# Altium footprint library PcbLibLafe.PcbLib: 294 footprints (part 18 of 19)
Each footprint in its own frame and in the unit in brackets; x right, y up, seen from the top. Pads: shape width x height; smd on the part's side, far side on the other; paste and mask are expansions set on the pad; w line width, h text height; cw(c..) or ccw(c..) is an arc to the next point about the centre after c.
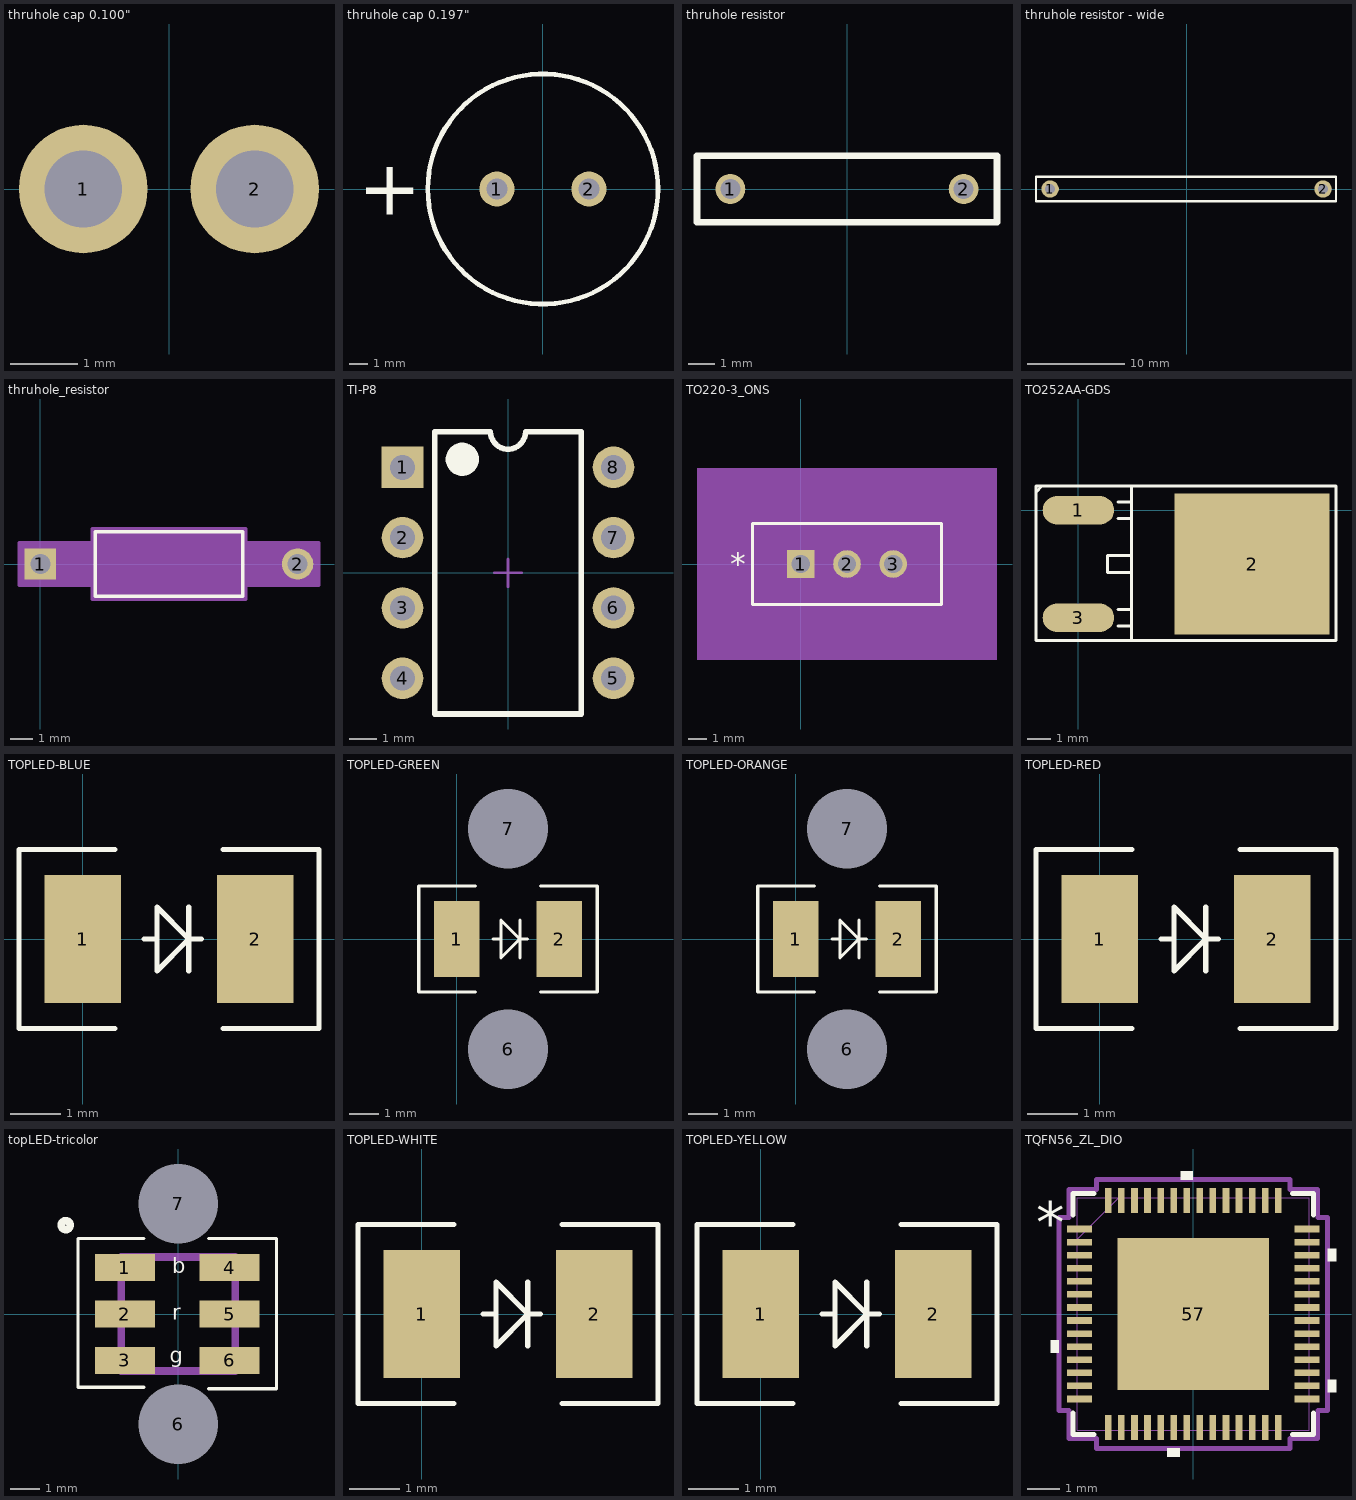
[diagram p17: the footprints below, top view; thin cyan lines are the x and y axes]

## thruhole cap 0.100" [mil]
pads (2):
  round 75 hole 45: 1(-50,0) 2(50,0)
3D body "C320C104K5R5TA.step": height 289.76, standoff -275.59, extent -100,-64 100,61.39

## thruhole cap 0.197" [mil] "radial cap"
pads (2):
  round 75 hole 45: 1(-98.43,0) 2(98.43,0)
Top Overlay:
  circle w10: c0,0 r246.06
  text "+" at -395.31,-54.99 h118.11
3D body "CAPPRD500W60D1250H2150.step": height 846.46, standoff -748.03, extent -244.06,-256.06 248.06,236.06

## thruhole resistor [mil] "thruhole resistor"
pads (2):
  round 45 hole 30: 1(-175,0) 2(175,0)
Top Overlay:
  lines w10: -225,-50 225,-50 225,50 -225,50 -225,-50

## thruhole resistor - wide [mil] "thruhole resistor"
pads (2):
  round 70 hole 40: 1(-550,0) 2(550,0)
Top Overlay:
  lines w10: -607,-50 -607,50 602,50 602,-50 -607,-50

## thruhole_resistor [mil]
pads (2):
  rect 55x55 / inner round 60 / far side rect 55x55 hole 35 paste-99999 mask+0: 1(0,0)
  round 55 / inner round 60 / far side round 55 hole 35 paste-99999 mask+0: 2(450,0)
Top Overlay:
  lines w6: 96,-56.5 354,-56.5 354,56.5 96,56.5 96,-56.5
Mechanical 13:
  lines w1: 0,0 101,0 ; 349,0 450,0 ; 101,-51.5 349,-51.5 349,51.5 101,51.5 101,-51.5
Mechanical 15:
  region: 91,-37.5 -37.5,-37.5 -37.5,37.5 91,37.5 91,61.5 359,61.5 359,37.5 487.5,37.5 487.5,-37.5 359,-37.5 359,-61.5 91,-61.5
  lines w6: -37.5,-37.5 -37.5,37.5 91,37.5 91,61.5 359,61.5 359,37.5 487.5,37.5 487.5,-37.5 359,-37.5 359,-61.5 91,-61.5 91,-37.5 -37.5,-37.5
3D body "STA_CF14_STP.step": height 103, standoff -110, extent -12.48,-51.12 462.48,51.12

## TI-P8 [mm] "DIP, 8-Leads, Body 9.59x6.35mm, Pitch 2.54mm"
height 5.08
pads (8):
  rect 1.5x1.5 hole 0.9: 1(-3.81,3.81)
  round 1.5 hole 0.9: 2(-3.81,1.27) 3(-3.81,-1.27) 4(-3.81,-3.81) 5(3.81,-3.81) 6(3.81,-1.27) 7(3.81,1.27) 8(3.81,3.81)
Top Overlay:
  circle w0.6: c-1.65,4.1 r0.3
  lines w0.2: -2.65,-5.1 -2.65,5.1 -0.635,5.1 ccw(c0,5.1) 0.635,5.1 2.65,5.1 2.65,-5.1 -2.65,-5.1
Mechanical 15:
  lines w0.1: -0.5,0 0.5,0 ; 0,-0.5 0,0.5
3D body: height 2.66, standoff 0, extent -3.945,3.31 -3.675,4.31
3D body: height 0, standoff -1.6, extent -3.945,3.45 -3.675,4.17
3D body: height 2.66, standoff 0, extent -3.945,0.77 -3.675,1.77
3D body: height 0, standoff -1.6, extent -3.945,0.91 -3.675,1.63
3D body: height 2.66, standoff 0, extent -3.945,-1.77 -3.675,-0.77
3D body: height 2.93, standoff 2.66, extent -3.945,-1.77 -3.3,-0.77
3D body: height 0, standoff -1.6, extent -3.945,-1.63 -3.675,-0.91
3D body: height 2.66, standoff 0, extent -3.945,-4.31 -3.675,-3.31
3D body: height 2.93, standoff 2.66, extent -3.945,-4.31 -3.3,-3.31
3D body: height 0, standoff -1.6, extent -3.945,-4.17 -3.675,-3.45
3D body: height 2.66, standoff 0, extent 3.675,-4.31 3.945,-3.31
3D body: height 2.93, standoff 2.66, extent 3.3,-4.31 3.945,-3.31
3D body: height 0, standoff -1.6, extent 3.675,-4.17 3.945,-3.45
3D body: height 2.66, standoff 0, extent 3.675,-1.77 3.945,-0.77
3D body: height 2.93, standoff 2.66, extent 3.3,-1.77 3.945,-0.77
3D body: height 0, standoff -1.6, extent 3.675,-1.63 3.945,-0.91
3D body: height 2.66, standoff 0, extent 3.675,0.77 3.945,1.77
3D body: height 2.93, standoff 2.66, extent 3.3,0.77 3.945,1.77
3D body: height 0, standoff -1.6, extent 3.675,0.91 3.945,1.63
3D body: height 2.66, standoff 0, extent 3.675,3.31 3.945,4.31
3D body: height 2.93, standoff 2.66, extent 3.3,3.31 3.945,4.31
3D body: height 0, standoff -1.6, extent 3.675,3.45 3.945,4.17

## TO220-3_ONS [mil]
pads (3):
  rect 60x60 hole 40 mask+0: 1(0,0)
  round 60 hole 40 mask+0: 2(100,0) 3(200,0)
Top Overlay:
  lines w6: -105,-87.5 305,-87.5 305,87.5 -105,87.5 -105,-87.5
  text "*" at -152.5,-25 h50
Mechanical 5:
  region: 425,-207.5 -225,-207.5 -225,207.5 425,207.5
Mechanical 13:
  lines w1: -100,-82.5 300,-82.5 300,82.5 -100,82.5 -100,-82.5
  text "*" at -102.5,-25 h50
Mechanical 15:
  region: 310,-92.5 -110,-92.5 -110,92.5 310,92.5
  lines w6: -110,-92.5 -110,92.5 310,92.5 310,-92.5 -110,-92.5
3D body "TO220-3_ONS.step": height 625, standoff -380, extent -100,-82.52 300,82.52

## TO252AA-GDS [mm]
pads (3):
  oval 3x1.2 smd: 1(0,0) 3(0,-4.5)
  rect 6.5x5.9 smd: 2(7.275,-2.25)
Top Overlay:
  lines w0.127: -1.778,0.762 -1.524,1.016 ; 1.65,-4.85 2.225,-4.85 ; 1.65,-4.15 2.225,-4.15 ; 2.225,-5.45 2.225,0.95 ; 2.225,-2.6 1.225,-2.6 1.225,-1.9 2.225,-1.9 ; -1.778,-5.461 -1.778,1.016 10.795,1.016 10.795,-5.461 -1.778,-5.461 ; 1.65,-0.35 2.225,-0.35 1.65,-0.35 ; 1.65,0.35 2.225,0.35 1.65,0.35
3D body "User Library-DPAK-1.step": height 2.41, standoff 0, extent -0.324,-5.505 9.614,1.035

## TOPLED-BLUE [mil]
pads (2):
  rect 60x100 smd: 1(0,0) 2(135,0)
Top Overlay:
  lines w4: 25,-70 -50,-70 -50,70 25,70 ; 83,-25 83,0 ; 83,25 83,0 ; 93,0 83,0 ; 110,-70 185,-70 185,70 110,70 ; 58,0 48,0 58,0 ; 58,0 58,25 83,0 ; 58,0 58,-25 83,0
3D body: height 61, standoff 60, extent -2.8,-60 20,-37.2
3D body: height 70, standoff 60, extent 30,-40 110,40
3D body: height 60, standoff 15, extent -2.8,-60 137.4,60
3D body: height 19.68, standoff 0, extent 40,-60 95,60
3D body: height 43.31, standoff 0, extent -19.53,-31.5 -7.72,32.48
3D body: height 43.31, standoff 27.56, extent -19.53,-31.5 -2.8,32.48
3D body: height 11.81, standoff 0, extent -19.53,-31.5 18.86,32.48
3D body: height 11.81, standoff 0, extent 115.75,-31.5 154.13,32.48
3D body: height 43.31, standoff 27.56, extent 137.4,-31.5 154.13,32.48
3D body: height 43.31, standoff 0, extent 142.32,-31.5 154.13,32.48
3D body: height 75, standoff 60, extent -2.8,-60 137.4,60
3D body: height 65, standoff 60, extent 60,-10 75,5
3D body: height 61, standoff 60, extent 54.69,-36.96 110.35,36.96
3D body: height 61, standoff 60, extent 30,-10 50,5

## TOPLED-GREEN [mil]
pads (4):
  rect 60x100 smd: 1(0,0) 2(135,0)
  round 60 hole 105 mask+50: 6(67.5,-145)
  round 60 hole 105: 7(67.5,145)
Top Overlay:
  lines w4: 25,-70 -50,-70 -50,70 25,70 ; 83,-25 83,0 ; 83,25 83,0 ; 93,0 83,0 ; 110,-70 185,-70 185,70 110,70 ; 58,0 58,-25 83,0 ; 58,0 48,0 58,0 ; 58,0 58,25 83,0
3D body: height 61, standoff 60, extent 30,-10 50,5
3D body: height 61, standoff 60, extent 54.69,-36.96 110.35,36.96
3D body: height 65, standoff 60, extent 60,-10 75,5
3D body: height 75, standoff 60, extent -4.65,-59.72 135.55,60.28
3D body: height 43.31, standoff 0, extent 142.32,-31.5 154.13,32.48
3D body: height 43.31, standoff 27.56, extent 137.4,-31.5 154.13,32.48
3D body: height 11.81, standoff 0, extent 115.75,-31.5 154.13,32.48
3D body: height 11.81, standoff 0, extent -19.53,-31.5 18.86,32.48
3D body: height 43.31, standoff 27.56, extent -19.53,-31.5 -2.8,32.48
3D body: height 43.31, standoff 0, extent -19.53,-31.5 -7.72,32.48
3D body: height 19.68, standoff 0, extent 40,-60 95,60
3D body: height 60, standoff 15, extent -2.8,-60 137.4,60
3D body: height 70, standoff 60, extent 30,-40 110,40
3D body: height 61, standoff 60, extent -2.8,-60 20,-37.2

## TOPLED-ORANGE [mil]
pads (4):
  rect 60x100 smd: 1(0,0) 2(135,0)
  round 60 hole 105 mask+50: 6(67.5,-145)
  round 60 hole 105: 7(67.5,145)
Top Overlay:
  lines w4: 25,-70 -50,-70 -50,70 25,70 ; 83,-25 83,0 ; 83,25 83,0 ; 93,0 83,0 ; 110,-70 185,-70 185,70 110,70 ; 58,0 48,0 58,0 ; 58,0 58,25 83,0 ; 58,0 58,-25 83,0
3D body: height 61, standoff 60, extent -2.8,-60 20,-37.2
3D body: height 70, standoff 60, extent 30,-40 110,40
3D body: height 60, standoff 15, extent -2.8,-60 137.4,60
3D body: height 19.68, standoff 0, extent 40,-60 95,60
3D body: height 43.31, standoff 0, extent -19.53,-31.5 -7.72,32.48
3D body: height 43.31, standoff 27.56, extent -19.53,-31.5 -2.8,32.48
3D body: height 11.81, standoff 0, extent -19.53,-31.5 18.86,32.48
3D body: height 11.81, standoff 0, extent 115.75,-31.5 154.13,32.48
3D body: height 43.31, standoff 27.56, extent 137.4,-31.5 154.13,32.48
3D body: height 43.31, standoff 0, extent 142.32,-31.5 154.13,32.48
3D body: height 75, standoff 60, extent -2.8,-60 137.4,60
3D body: height 65, standoff 60, extent 60,-10 75,5
3D body: height 61, standoff 60, extent 54.69,-36.96 110.35,36.96
3D body: height 61, standoff 60, extent 30,-10 50,5

## TOPLED-RED [mil]
pads (2):
  rect 60x100 smd: 1(0,0) 2(135,0)
Top Overlay:
  lines w4: 25,-70 -50,-70 -50,70 25,70 ; 83,-25 83,0 ; 83,25 83,0 ; 93,0 83,0 ; 110,-70 185,-70 185,70 110,70 ; 58,0 48,0 58,0 ; 58,0 58,25 83,0 ; 58,0 58,-25 83,0
3D body: height 61, standoff 60, extent -2.8,-60 20,-37.2
3D body: height 70, standoff 60, extent 30,-40 110,40
3D body: height 60, standoff 15, extent -2.8,-60 137.4,60
3D body: height 19.68, standoff 0, extent 40,-60 95,60
3D body: height 43.31, standoff 0, extent -19.53,-31.5 -7.72,32.48
3D body: height 43.31, standoff 27.56, extent -19.53,-31.5 -2.8,32.48
3D body: height 11.81, standoff 0, extent -19.53,-31.5 18.86,32.48
3D body: height 11.81, standoff 0, extent 115.75,-31.5 154.13,32.48
3D body: height 43.31, standoff 27.56, extent 137.4,-31.5 154.13,32.48
3D body: height 43.31, standoff 0, extent 142.32,-31.5 154.13,32.48
3D body: height 75, standoff 60, extent -2.8,-60 137.4,60
3D body: height 65, standoff 60, extent 60,-10 75,5
3D body: height 61, standoff 60, extent 54.69,-36.96 110.35,36.96
3D body: height 61, standoff 60, extent 30,-10 50,5

## topLED-tricolor [mm]
pads (8):
  rect 2x0.9 smd: 1(-1.778,1.55) 2(-1.778,0) 3(-1.778,-1.55) 4(1.722,1.55) 5(1.722,0) 6(1.722,-1.55)
  round 1.524 hole 2.667 mask+1.27: 6(0,-3.683)
  round 1.524 hole 2.667: 7(0,3.683)
Top Overlay:
  circle w0.254: c-3.759,2.971 r0.148
  lines w0.102: -1.143,-2.45 -3.353,-2.45 -3.353,2.525 -1.143,2.525 ; 1.016,-2.5 3.297,-2.5 3.297,2.525 1.016,2.525
  text "b" at -0.203,1.371 h0.51
  text "r" at -0.191,-0.189 h0.51
  text "g" at -0.279,-1.635 h0.51
Mechanical 3:
  lines w0.254: -1.905,-1.905 -1.905,1.905 1.905,1.905 1.905,-1.905 -1.905,-1.905

## TOPLED-WHITE [mil]
pads (2):
  rect 60x100 smd: 1(0,0) 2(135,0)
Top Overlay:
  lines w4: 25,-70 -50,-70 -50,70 25,70 ; 83,-25 83,0 ; 83,25 83,0 ; 93,0 83,0 ; 110,-70 185,-70 185,70 110,70 ; 58,0 58,-25 83,0 ; 58,0 48,0 58,0 ; 58,0 58,25 83,0
3D body: height 61, standoff 60, extent 30,-10 50,5
3D body: height 61, standoff 60, extent 54.69,-36.96 110.35,36.96
3D body: height 65, standoff 60, extent 60,-10 75,5
3D body: height 75, standoff 60, extent -2.8,-60 137.4,60
3D body: height 43.31, standoff 0, extent 142.32,-31.5 154.13,32.48
3D body: height 43.31, standoff 27.56, extent 137.4,-31.5 154.13,32.48
3D body: height 11.81, standoff 0, extent 115.75,-31.5 154.13,32.48
3D body: height 11.81, standoff 0, extent -19.53,-31.5 18.86,32.48
3D body: height 43.31, standoff 27.56, extent -19.53,-31.5 -2.8,32.48
3D body: height 43.31, standoff 0, extent -19.53,-31.5 -7.72,32.48
3D body: height 19.68, standoff 0, extent 40,-60 95,60
3D body: height 60, standoff 15, extent -2.8,-60 137.4,60
3D body: height 70, standoff 60, extent 30,-40 110,40
3D body: height 61, standoff 60, extent -2.8,-60 20,-37.2

## TOPLED-YELLOW [mil]
pads (2):
  rect 60x100 smd: 1(0,0) 2(135,0)
Top Overlay:
  lines w4: 25,-70 -50,-70 -50,70 25,70 ; 83,-25 83,0 ; 83,25 83,0 ; 93,0 83,0 ; 110,-70 185,-70 185,70 110,70 ; 58,0 58,-25 83,0 ; 58,0 48,0 58,0 ; 58,0 58,25 83,0
3D body: height 61, standoff 60, extent 30,-10 50,5
3D body: height 61, standoff 60, extent 54.69,-36.96 110.35,36.96
3D body: height 65, standoff 60, extent 60,-10 75,5
3D body: height 75, standoff 60, extent -2.8,-60 137.4,60
3D body: height 43.31, standoff 0, extent 142.32,-31.5 154.13,32.48
3D body: height 43.31, standoff 27.56, extent 137.4,-31.5 154.13,32.48
3D body: height 11.81, standoff 0, extent 115.75,-31.5 154.13,32.48
3D body: height 11.81, standoff 0, extent -19.53,-31.5 18.86,32.48
3D body: height 43.31, standoff 27.56, extent -19.53,-31.5 -2.8,32.48
3D body: height 43.31, standoff 0, extent -19.53,-31.5 -7.72,32.48
3D body: height 19.68, standoff 0, extent 40,-60 95,60
3D body: height 60, standoff 15, extent -2.8,-60 137.4,60
3D body: height 70, standoff 60, extent 30,-40 110,40
3D body: height 61, standoff 60, extent -2.8,-60 20,-37.2

## TQFN56_ZL_DIO [mil]
pads (57):
  rect 30x8 smd paste+0 mask+0: 1(-137,102.36) 2(-137,86.61) 3(-137,70.87) 4(-137,55.12) 5(-137,39.37) 6(-137,23.62) 7(-137,7.87) 8(-137,-7.87) 9(-137,-23.62) 10(-137,-39.37) 11(-137,-55.12) 12(-137,-70.87) 13(-137,-86.61) 14(-137,-102.36) 29(137,-102.36) 30(137,-86.61) 31(137,-70.87) 32(137,-55.12) 33(137,-39.37) 34(137,-23.62) 35(137,-7.87) 36(137,7.87) 37(137,23.62) 38(137,39.37) 39(137,55.12) 40(137,70.87) 41(137,86.61) 42(137,102.36)
  rect 8x30 smd paste+0 mask+0: 15(-102.36,-137) 16(-86.61,-137) 17(-70.87,-137) 18(-55.12,-137) 19(-39.37,-137) 20(-23.62,-137) 21(-7.87,-137) 22(7.87,-137) 23(23.62,-137) 24(39.37,-137) 25(55.12,-137) 26(70.87,-137) 27(86.61,-137) 28(102.36,-137) 43(102.36,137) 44(86.61,137) 45(70.87,137) 46(55.12,137) 47(39.37,137) 48(23.62,137) 49(7.87,137) 50(-7.87,137) 51(-23.62,137) 52(-39.37,137) 53(-55.12,137) 54(-70.87,137) 55(-86.61,137) 56(-102.36,137)
  rect 183x183 smd paste-91 mask+0: 57(0,0)
Top Overlay:
  region: -0.37,162 -15.37,162 -15.37,172 -0.37,172
  region: 162,78.37 172,78.37 172,63.37 162,63.37
  region: 162,-79.11 172,-79.11 172,-94.11 162,-94.11
  region: -16.12,-162 -31.12,-162 -31.12,-172 -16.12,-172
  region: -162,-31.87 -172,-31.87 -172,-46.87 -162,-46.87
  lines w6: -145,-119.46 -145,-145 -119.46,-145 ; -145,119.46 -145,145 -119.46,145 ; 119.46,-145 145,-145 145,-119.46 ; 119.46,145 145,145 145,119.46
  text "*" at -189.5,85.24 h50
Top Paste:
  region: 87.56,-34.44 34.44,-34.44 34.44,-87.56 87.56,-87.56
  region: 87.56,26.56 34.44,26.56 34.44,-26.56 87.56,-26.56
  region: 87.56,87.56 34.44,87.56 34.44,34.44 87.56,34.44
  region: 26.56,-34.44 -26.56,-34.44 -26.56,-87.56 26.56,-87.56
  region: 26.56,26.56 -26.56,26.56 -26.56,-26.56 26.56,-26.56
  region: 26.56,87.56 -26.56,87.56 -26.56,34.44 26.56,34.44
  region: -34.44,-34.44 -87.56,-34.44 -87.56,-87.56 -34.44,-87.56
  region: -34.44,26.56 -87.56,26.56 -87.56,-26.56 -34.44,-26.56
  region: -34.44,87.56 -87.56,87.56 -87.56,34.44 -34.44,34.44
Mechanical 13:
  lines w1: -140,90 -90,140 ; -140,-140 -140,140 140,140 140,-140 -140,-140 ; -140,-107.36 -140,-97.36 -140,-107.36 ; -140,-91.61 -140,-81.61 -140,-91.61 ; -140,-75.87 -140,-65.87 -140,-75.87 ; -140,-60.12 -140,-50.12 -140,-60.12 ; -140,-44.37 -140,-34.37 -140,-44.37 ; -140,-28.62 -140,-18.62 -140,-28.62 ; -140,-12.87 -140,-2.87 -140,-12.87 ; -140,2.87 -140,12.87 -140,2.87 ; -140,18.62 -140,28.62 -140,18.62 ; -140,34.37 -140,44.37 -140,34.37 ; -140,50.12 -140,60.12 -140,50.12 ; -140,65.87 -140,75.87 -140,65.87 ; -140,81.61 -140,91.61 -140,81.61 ; -140,97.36 -140,107.36 -140,97.36 ; -107.36,-140 -97.36,-140 -107.36,-140 ; -107.36,140 -97.36,140 -107.36,140 ; -91.61,-140 -81.61,-140 -91.61,-140 ; -91.61,140 -81.61,140 -91.61,140 ; -75.87,-140 -65.87,-140 -75.87,-140 ; -75.87,140 -65.87,140 -75.87,140 ; -60.12,-140 -50.12,-140 -60.12,-140 ; -60.12,140 -50.12,140 -60.12,140 ; -44.37,-140 -34.37,-140 -44.37,-140 ; -44.37,140 -34.37,140 -44.37,140 ; -28.62,-140 -18.62,-140 -28.62,-140 ; -28.62,140 -18.62,140 -28.62,140 ; -12.87,-140 -2.87,-140 -12.87,-140 ; -12.87,140 -2.87,140 -12.87,140 ; 2.87,-140 12.87,-140 2.87,-140 ; 2.87,140 12.87,140 2.87,140 ; 18.62,-140 28.62,-140 18.62,-140 ; 18.62,140 28.62,140 18.62,140 ; 34.37,-140 44.37,-140 34.37,-140 ; 34.37,140 44.37,140 34.37,140 ; 50.12,-140 60.12,-140 50.12,-140 ; 50.12,140 60.12,140 50.12,140 ; 65.87,-140 75.87,-140 65.87,-140 ; 65.87,140 75.87,140 65.87,140 ; 81.61,-140 91.61,-140 81.61,-140 ; 81.61,140 91.61,140 81.61,140 ; 97.36,-140 107.36,-140 97.36,-140 ; 97.36,140 107.36,140 97.36,140 ; 140,-107.36 140,-97.36 140,-107.36 ; 140,-91.61 140,-81.61 140,-91.61 ; 140,-75.87 140,-65.87 140,-75.87 ; 140,-60.12 140,-50.12 140,-60.12 ; 140,-44.37 140,-34.37 140,-44.37 ; 140,-28.62 140,-18.62 140,-28.62 ; 140,-12.87 140,-2.87 140,-12.87 ; 140,2.87 140,12.87 140,2.87 ; 140,18.62 140,28.62 140,18.62 ; 140,34.37 140,44.37 140,34.37 ; 140,50.12 140,60.12 140,50.12 ; 140,65.87 140,75.87 140,65.87 ; 140,81.61 140,91.61 140,81.61 ; 140,97.36 140,107.36 140,97.36
Mechanical 15:
  lines w6: -162,-116.36 -162,116.36 -150,116.36 -150,150 -116.36,150 -116.36,162 116.36,162 116.36,150 150,150 150,116.36 162,116.36 162,-116.36 150,-116.36 150,-150 116.36,-150 116.36,-162 -116.36,-162 -116.36,-150 -150,-150 -150,-116.36 -162,-116.36
3D body "TQFN56_ZL_DIO.step": height 32.09, standoff 0, extent -139.99,-139.99 140.01,140.01
3D body: height 10, standoff 0, extent 0,0 10,10